# Altium schematic symbol library jlcpcb_2025_04_capacitors_extended_0603.schlib: 3668 symbols (part 7 of 20) (continued)
## C0603N222J050T
designator C?  Capacitance: 2.2nF  (hidden comment: *)
Capacitor, Ceramic (MLCC), 2.2nF, ±5%, 50V, NP0, ±5%, SMD 0603; Manufacturer: IHHEC(HOLY STONE ENTERPRISE CO., LTD); Manufacturer Part Number: C0603N222J050T; Package Size: 0603; JLCPCB Basic Part: No; JLCPCB Part Number: C105905; Supplier 1: LCSC; Category: Capacitors - MLCC; Supplier Part Number 1: C105905; Tolerance: ±5%; Voltage Rating: 50V; Temperature Coefficient: NP0; RoHS: Yes; ComponentLink1Description: Datasheet; ComponentLink1URL: https://wmsc.lcsc.com/wmsc/upload/file/pdf/v2/lcsc/2304140030_IHHEC-HOLY-STONE-ENTERPRISE-CO---LTD-C0603N222J050T_C105905.pdf; ComponentLink2Description: JLCPCB Part URL; ComponentLink2URL: https://jlcpcb.com/partdetail/C105905; ComponentLink3Description: LCSC Part URL; ComponentLink3URL: https://lcsc.com/product-detail/Multilayer-Ceramic-Capacitors-MLCC---SMD-SMT_IHHECHOLY-STONE-ENTERPRISE-CO.%2C-LTD-IHHECHOLY-STONE-ENTERPRISE-CO.%2C-LTD-C0603N222J050T_C105905.html
footprint CAP-0603 (0603 (1608M) Capacitor)
pins: 1, 2

## C0603N470J050T
designator C?  Capacitance: 47pF  (hidden comment: *)
Capacitor, Ceramic (MLCC), 47pF, ±5%, 50V, NP0, ±5%, SMD 0603; Manufacturer: IHHEC(HOLY STONE ENTERPRISE CO., LTD); Manufacturer Part Number: C0603N470J050T; Package Size: 0603; JLCPCB Basic Part: No; JLCPCB Part Number: C915825; Supplier 1: LCSC; Category: Capacitors - MLCC; Supplier Part Number 1: C915825; Tolerance: ±5%; Voltage Rating: 50V; Temperature Coefficient: NP0; RoHS: Yes; ComponentLink1Description: Datasheet; ComponentLink1URL: https://wmsc.lcsc.com/wmsc/upload/file/pdf/v2/lcsc/2304140030_IHHEC-HOLY-STONE-ENTERPRISE-CO---LTD-C0603N470J050T_C915825.pdf; ComponentLink2Description: JLCPCB Part URL; ComponentLink2URL: https://jlcpcb.com/partdetail/C915825; ComponentLink3Description: LCSC Part URL; ComponentLink3URL: https://lcsc.com/product-detail/Multilayer-Ceramic-Capacitors-MLCC---SMD-SMT_IHHECHOLY-STONE-ENTERPRISE-CO.%2C-LTD-IHHECHOLY-STONE-ENTERPRISE-CO.%2C-LTD-C0603N470J050T_C915825.html
footprint CAP-0603 (0603 (1608M) Capacitor)
pins: 1, 2

## C0603X5R105K160NT
designator C?  Capacitance: 1uF  (hidden comment: *)
Capacitor, Ceramic (MLCC), 1uF, ±10%, 16V, X5R, ±10%, SMD 0603; Manufacturer: SANYEAR; Manufacturer Part Number: C0603X5R105K160NT; Package Size: 0603; JLCPCB Basic Part: No; JLCPCB Part Number: C475249; Supplier 1: LCSC; Category: Capacitors - MLCC; Supplier Part Number 1: C475249; Tolerance: ±10%; Voltage Rating: 16V; Temperature Coefficient: X5R; RoHS: Yes; ComponentLink1Description: Datasheet; ComponentLink1URL: https://wmsc.lcsc.com/wmsc/upload/file/pdf/v2/lcsc/2304140030_SANYEAR-C0603X5R105K160NT_C475249.pdf; ComponentLink2Description: JLCPCB Part URL; ComponentLink2URL: https://jlcpcb.com/partdetail/C475249; ComponentLink3Description: LCSC Part URL; ComponentLink3URL: https://lcsc.com/product-detail/Multilayer-Ceramic-Capacitors-MLCC---SMD-SMT_SANYEAR-SANYEAR-C0603X5R105K160NT_C475249.html
footprint CAP-0603 (0603 (1608M) Capacitor)
pins: 1, 2

## C0603X5R105K250NT
designator C?  Capacitance: 1uF  (hidden comment: *)
Capacitor, Ceramic (MLCC), 1uF, ±10%, 25V, X5R, ±10%, SMD 0603; Manufacturer: SANYEAR; Manufacturer Part Number: C0603X5R105K250NT; Package Size: 0603; JLCPCB Basic Part: No; JLCPCB Part Number: C466771; Supplier 1: LCSC; Category: Capacitors - MLCC; Supplier Part Number 1: C466771; Tolerance: ±10%; Voltage Rating: 25V; Temperature Coefficient: X5R; RoHS: Yes; ComponentLink1Description: Datasheet; ComponentLink1URL: https://wmsc.lcsc.com/wmsc/upload/file/pdf/v2/lcsc/2304140030_SANYEAR-C0603X5R105K250NT_C466771.pdf; ComponentLink2Description: JLCPCB Part URL; ComponentLink2URL: https://jlcpcb.com/partdetail/C466771; ComponentLink3Description: LCSC Part URL; ComponentLink3URL: https://lcsc.com/product-detail/Multilayer-Ceramic-Capacitors-MLCC---SMD-SMT_SANYEAR-SANYEAR-C0603X5R105K250NT_C466771.html
footprint CAP-0603 (0603 (1608M) Capacitor)
pins: 1, 2

## C0603X5R106K6R3NT
designator C?  Capacitance: 10uF  (hidden comment: *)
Capacitor, Ceramic (MLCC), 10uF, ±10%, 6.3V, X5R, ±10%, SMD 0603; Manufacturer: SANYEAR; Manufacturer Part Number: C0603X5R106K6R3NT; Package Size: 0603; JLCPCB Basic Part: No; JLCPCB Part Number: C475250; Supplier 1: LCSC; Category: Capacitors - MLCC; Supplier Part Number 1: C475250; Tolerance: ±10%; Voltage Rating: 6.3V; Temperature Coefficient: X5R; RoHS: Yes; ComponentLink1Description: Datasheet; ComponentLink1URL: https://wmsc.lcsc.com/wmsc/upload/file/pdf/v2/lcsc/2304140030_SANYEAR-C0603X5R106K6R3NT_C475250.pdf; ComponentLink2Description: JLCPCB Part URL; ComponentLink2URL: https://jlcpcb.com/partdetail/C475250; ComponentLink3Description: LCSC Part URL; ComponentLink3URL: https://lcsc.com/product-detail/Multilayer-Ceramic-Capacitors-MLCC---SMD-SMT_SANYEAR-SANYEAR-C0603X5R106K6R3NT_C475250.html
footprint CAP-0603 (0603 (1608M) Capacitor)
pins: 1, 2

## C0603X5R106K6R3NTK
designator C?  Capacitance: 10uF  (hidden comment: *)
Capacitor, Ceramic (MLCC), 10uF, ±10%, 6.3V, X5R, ±10%, SMD 0603; Manufacturer: EYANG(Shenzhen Eyang Tech Development); Manufacturer Part Number: C0603X5R106K6R3NTK; Package Size: 0603; JLCPCB Basic Part: No; JLCPCB Part Number: C115692; Supplier 1: LCSC; Category: Capacitors - MLCC; Supplier Part Number 1: C115692; Tolerance: ±10%; Voltage Rating: 6.3V; Temperature Coefficient: X5R; RoHS: Yes; ComponentLink1Description: Datasheet; ComponentLink1URL: https://datasheet.lcsc.com/lcsc/2304140030_EYANG-Shenzhen-Eyang-Tech-Development-C0603X5R106K6R3NTK_C115692.pdf; ComponentLink2Description: JLCPCB Part URL; ComponentLink2URL: https://jlcpcb.com/partdetail/C115692; ComponentLink3Description: LCSC Part URL; ComponentLink3URL: https://lcsc.com/product-detail/Multilayer-Ceramic-Capacitors-MLCC---SMD-SMT_EYANGShenzhen-Eyang-Tech-Development-EYANGShenzhen-Eyang-Tech-Development-C0603X5R106K6R3NTK_C115692.html
footprint CAP-0603 (0603 (1608M) Capacitor)
pins: 1, 2

## C0603X5R106M100NT
designator C?  Capacitance: 10uF  (hidden comment: *)
Capacitor, Ceramic (MLCC), 10uF, ±20%, 10V, X5R, ±20%, SMD 0603; Manufacturer: SANYEAR; Manufacturer Part Number: C0603X5R106M100NT; Package Size: 0603; JLCPCB Basic Part: No; JLCPCB Part Number: C466780; Supplier 1: LCSC; Category: Capacitors - MLCC; Supplier Part Number 1: C466780; Tolerance: ±20%; Voltage Rating: 10V; Temperature Coefficient: X5R; RoHS: Yes; ComponentLink1Description: Datasheet; ComponentLink1URL: https://wmsc.lcsc.com/wmsc/upload/file/pdf/v2/lcsc/2304140030_SANYEAR-C0603X5R106M100NT_C466780.pdf; ComponentLink2Description: JLCPCB Part URL; ComponentLink2URL: https://jlcpcb.com/partdetail/C466780; ComponentLink3Description: LCSC Part URL; ComponentLink3URL: https://lcsc.com/product-detail/Multilayer-Ceramic-Capacitors-MLCC---SMD-SMT_SANYEAR-SANYEAR-C0603X5R106M100NT_C466780.html
footprint CAP-0603 (0603 (1608M) Capacitor)
pins: 1, 2

## C0603X5R106M160NT
designator C?  Capacitance: 10uF  (hidden comment: *)
Capacitor, Ceramic (MLCC), 10uF, ±20%, 16V, X5R, ±20%, SMD 0603; Manufacturer: SANYEAR; Manufacturer Part Number: C0603X5R106M160NT; Package Size: 0603; JLCPCB Basic Part: No; JLCPCB Part Number: C466781; Supplier 1: LCSC; Category: Capacitors - MLCC; Supplier Part Number 1: C466781; Tolerance: ±20%; Voltage Rating: 16V; Temperature Coefficient: X5R; RoHS: Yes; ComponentLink1Description: Datasheet; ComponentLink1URL: https://wmsc.lcsc.com/wmsc/upload/file/pdf/v2/lcsc/2304140030_SANYEAR-C0603X5R106M160NT_C466781.pdf; ComponentLink2Description: JLCPCB Part URL; ComponentLink2URL: https://jlcpcb.com/partdetail/C466781; ComponentLink3Description: LCSC Part URL; ComponentLink3URL: https://lcsc.com/product-detail/Multilayer-Ceramic-Capacitors-MLCC---SMD-SMT_SANYEAR-SANYEAR-C0603X5R106M160NT_C466781.html
footprint CAP-0603 (0603 (1608M) Capacitor)
pins: 1, 2

## C0603X5R225K160NT
designator C?  Capacitance: 2.2uF  (hidden comment: *)
Capacitor, Ceramic (MLCC), 2.2uF, ±10%, 16V, ±10%, SMD 0603; Manufacturer: SANYEAR; Manufacturer Part Number: C0603X5R225K160NT; Package Size: 0603; JLCPCB Basic Part: No; JLCPCB Part Number: C466773; Supplier 1: LCSC; Category: Capacitors - MLCC; Supplier Part Number 1: C466773; Tolerance: ±10%; Voltage Rating: 16V; RoHS: Yes; ComponentLink1Description: Datasheet; ComponentLink1URL: https://wmsc.lcsc.com/wmsc/upload/file/pdf/v2/lcsc/2304140030_SANYEAR-C0603X5R225K160NT_C466773.pdf; ComponentLink2Description: JLCPCB Part URL; ComponentLink2URL: https://jlcpcb.com/partdetail/C466773; ComponentLink3Description: LCSC Part URL; ComponentLink3URL: https://lcsc.com/product-detail/Multilayer-Ceramic-Capacitors-MLCC---SMD-SMT_SANYEAR-SANYEAR-C0603X5R225K160NT_C466773.html
footprint CAP-0603 (0603 (1608M) Capacitor)
pins: 1, 2

## C0603X5R474K500NT
designator C?  Capacitance: 470nF  (hidden comment: *)
Capacitor, Ceramic (MLCC), 470nF, ±10%, 50V, ±10%, SMD 0603; Manufacturer: SANYEAR; Manufacturer Part Number: C0603X5R474K500NT; Package Size: 0603; JLCPCB Basic Part: No; JLCPCB Part Number: C729461; Supplier 1: LCSC; Category: Capacitors - MLCC; Supplier Part Number 1: C729461; Tolerance: ±10%; Voltage Rating: 50V; RoHS: Yes; ComponentLink1Description: Datasheet; ComponentLink1URL: https://wmsc.lcsc.com/wmsc/upload/file/pdf/v2/lcsc/2304140030_SANYEAR-C0603X5R474K500NT_C729461.pdf; ComponentLink2Description: JLCPCB Part URL; ComponentLink2URL: https://jlcpcb.com/partdetail/C729461; ComponentLink3Description: LCSC Part URL; ComponentLink3URL: https://lcsc.com/product-detail/Multilayer-Ceramic-Capacitors-MLCC---SMD-SMT_SANYEAR-SANYEAR-C0603X5R474K500NT_C729461.html
footprint CAP-0603 (0603 (1608M) Capacitor)
pins: 1, 2

## C0603X6S106M4R0NT
designator C?  Capacitance: 10uF  (hidden comment: *)
Capacitor, Ceramic (MLCC), 10uF, ±20%, 4V, ±20%, SMD 0603; Manufacturer: SANYEAR; Manufacturer Part Number: C0603X6S106M4R0NT; Package Size: 0603; JLCPCB Basic Part: No; JLCPCB Part Number: C2844382; Supplier 1: LCSC; Category: Capacitors - MLCC; Supplier Part Number 1: C2844382; Tolerance: ±20%; Voltage Rating: 4V; RoHS: Yes; ComponentLink1Description: Datasheet; ComponentLink1URL: https://wmsc.lcsc.com/wmsc/upload/file/pdf/v2/lcsc/2304140030_SANYEAR-C0603X6S106M4R0NT_C2844382.pdf; ComponentLink2Description: JLCPCB Part URL; ComponentLink2URL: https://jlcpcb.com/partdetail/C2844382; ComponentLink3Description: LCSC Part URL; ComponentLink3URL: https://lcsc.com/product-detail/Multilayer-Ceramic-Capacitors-MLCC---SMD-SMT_SANYEAR-SANYEAR-C0603X6S106M4R0NT_C2844382.html
footprint CAP-0603 (0603 (1608M) Capacitor)
pins: 1, 2

## C0603X6S106M160NT
designator C?  Capacitance: 10uF  (hidden comment: *)
Capacitor, Ceramic (MLCC), 10uF, ±20%, 16V, ±20%, SMD 0603; Manufacturer: SANYEAR; Manufacturer Part Number: C0603X6S106M160NT; Package Size: 0603; JLCPCB Basic Part: No; JLCPCB Part Number: C2835565; Supplier 1: LCSC; Category: Capacitors - MLCC; Supplier Part Number 1: C2835565; Tolerance: ±20%; Voltage Rating: 16V; RoHS: Yes; ComponentLink1Description: Datasheet; ComponentLink1URL: https://wmsc.lcsc.com/wmsc/upload/file/pdf/v2/lcsc/2304140030_SANYEAR-C0603X6S106M160NT_C2835565.pdf; ComponentLink2Description: JLCPCB Part URL; ComponentLink2URL: https://jlcpcb.com/partdetail/C2835565; ComponentLink3Description: LCSC Part URL; ComponentLink3URL: https://lcsc.com/product-detail/Multilayer-Ceramic-Capacitors-MLCC---SMD-SMT_SANYEAR-SANYEAR-C0603X6S106M160NT_C2835565.html
footprint CAP-0603 (0603 (1608M) Capacitor)
pins: 1, 2

## C0603X6S226M6R3NT
designator C?  Capacitance: 22uF  (hidden comment: *)
Capacitor, Ceramic (MLCC), 22uF, ±20%, 6.3V, ±20%, SMD 0603; Manufacturer: SANYEAR; Manufacturer Part Number: C0603X6S226M6R3NT; Package Size: 0603; JLCPCB Basic Part: No; JLCPCB Part Number: C2835554; Supplier 1: LCSC; Category: Capacitors - MLCC; Supplier Part Number 1: C2835554; Tolerance: ±20%; Voltage Rating: 6.3V; RoHS: Yes; ComponentLink1Description: Datasheet; ComponentLink1URL: https://wmsc.lcsc.com/wmsc/upload/file/pdf/v2/lcsc/2304140030_SANYEAR-C0603X6S226M6R3NT_C2835554.pdf; ComponentLink2Description: JLCPCB Part URL; ComponentLink2URL: https://jlcpcb.com/partdetail/C2835554; ComponentLink3Description: LCSC Part URL; ComponentLink3URL: https://lcsc.com/product-detail/Multilayer-Ceramic-Capacitors-MLCC---SMD-SMT_SANYEAR-SANYEAR-C0603X6S226M6R3NT_C2835554.html
footprint CAP-0603 (0603 (1608M) Capacitor)
pins: 1, 2

## C0603X6S475K6R3NT
designator C?  Capacitance: 4.7uF  (hidden comment: *)
Capacitor, Ceramic (MLCC), 4.7uF, ±10%, 6.3V, ±10%, SMD 0603; Manufacturer: SANYEAR; Manufacturer Part Number: C0603X6S475K6R3NT; Package Size: 0603; JLCPCB Basic Part: No; JLCPCB Part Number: C2844381; Supplier 1: LCSC; Category: Capacitors - MLCC; Supplier Part Number 1: C2844381; Tolerance: ±10%; Voltage Rating: 6.3V; RoHS: Yes; ComponentLink1Description: Datasheet; ComponentLink1URL: https://wmsc.lcsc.com/wmsc/upload/file/pdf/v2/lcsc/2304140030_SANYEAR-C0603X6S475K6R3NT_C2844381.pdf; ComponentLink2Description: JLCPCB Part URL; ComponentLink2URL: https://jlcpcb.com/partdetail/C2844381; ComponentLink3Description: LCSC Part URL; ComponentLink3URL: https://lcsc.com/product-detail/Multilayer-Ceramic-Capacitors-MLCC---SMD-SMT_SANYEAR-SANYEAR-C0603X6S475K6R3NT_C2844381.html
footprint CAP-0603 (0603 (1608M) Capacitor)
pins: 1, 2

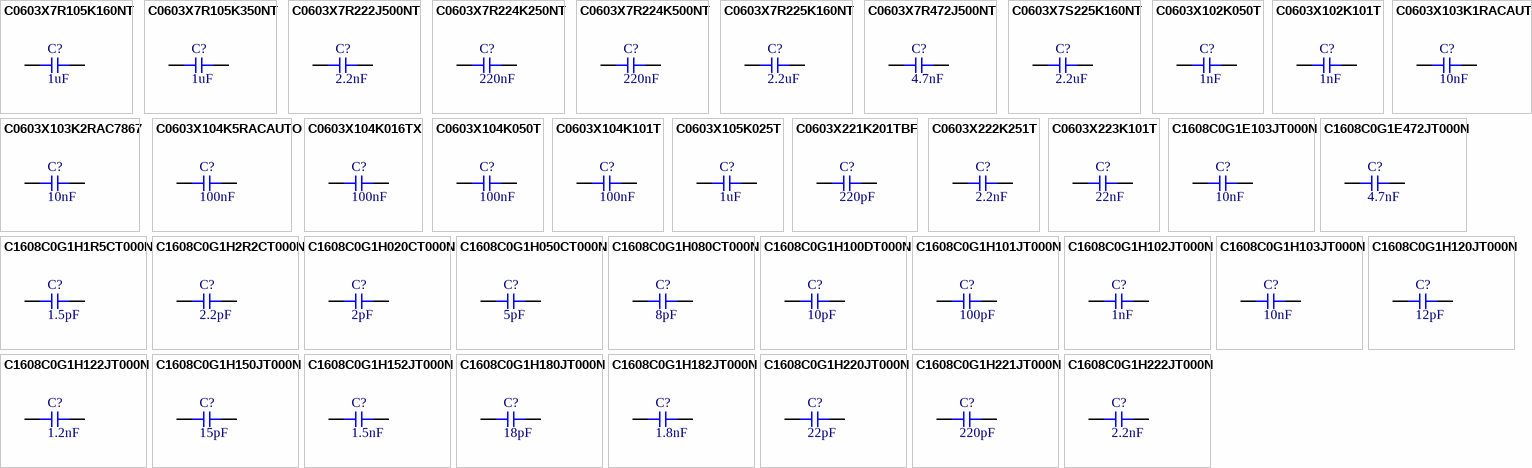
[diagram p29: symbols C0603X7R105K160NT to C1608C0G1H222JT000N]

## C0603X7R105K160NT
designator C?  Capacitance: 1uF  (hidden comment: *)
Capacitor, Ceramic (MLCC), 1uF, ±10%, 16V, X7R, ±10%, SMD 0603; Manufacturer: SANYEAR; Manufacturer Part Number: C0603X7R105K160NT; Package Size: 0603; JLCPCB Basic Part: No; JLCPCB Part Number: C466770; Supplier 1: LCSC; Category: Capacitors - MLCC; Supplier Part Number 1: C466770; Tolerance: ±10%; Voltage Rating: 16V; Temperature Coefficient: X7R; RoHS: Yes; ComponentLink1Description: Datasheet; ComponentLink1URL: https://wmsc.lcsc.com/wmsc/upload/file/pdf/v2/lcsc/2304140030_SANYEAR-C0603X7R105K160NT_C466770.pdf; ComponentLink2Description: JLCPCB Part URL; ComponentLink2URL: https://jlcpcb.com/partdetail/C466770; ComponentLink3Description: LCSC Part URL; ComponentLink3URL: https://lcsc.com/product-detail/Multilayer-Ceramic-Capacitors-MLCC---SMD-SMT_SANYEAR-SANYEAR-C0603X7R105K160NT_C466770.html
footprint CAP-0603 (0603 (1608M) Capacitor)
pins: 1, 2

## C0603X7R105K350NT
designator C?  Capacitance: 1uF  (hidden comment: *)
Capacitor, Ceramic (MLCC), 1uF, ±10%, 35V, ±10%, SMD 0603; Manufacturer: SANYEAR; Manufacturer Part Number: C0603X7R105K350NT; Package Size: 0603; JLCPCB Basic Part: No; JLCPCB Part Number: C968776; Supplier 1: LCSC; Category: Capacitors - MLCC; Supplier Part Number 1: C968776; Tolerance: ±10%; Voltage Rating: 35V; RoHS: Yes; ComponentLink1Description: Datasheet; ComponentLink2Description: JLCPCB Part URL; ComponentLink2URL: https://jlcpcb.com/partdetail/C968776; ComponentLink3Description: LCSC Part URL; ComponentLink3URL: https://lcsc.com/product-detail/Multilayer-Ceramic-Capacitors-MLCC---SMD-SMT_SANYEAR-SANYEAR-C0603X7R105K350NT_C968776.html
footprint CAP-0603 (0603 (1608M) Capacitor)
pins: 1, 2

## C0603X7R222J500NT
designator C?  Capacitance: 2.2nF  (hidden comment: *)
Capacitor, Ceramic (MLCC), 2.2nF, 50V, SMD 0603; Manufacturer: SANYEAR; Manufacturer Part Number: C0603X7R222J500NT; Package Size: 0603; JLCPCB Basic Part: No; JLCPCB Part Number: C2835545; Supplier 1: LCSC; Category: Capacitors - MLCC; Supplier Part Number 1: C2835545; Voltage Rating: 50V; RoHS: Yes; ComponentLink1Description: Datasheet; ComponentLink1URL: https://wmsc.lcsc.com/wmsc/upload/file/pdf/v2/lcsc/2304140030_SANYEAR-C0603X7R222J500NT_C2835545.pdf; ComponentLink2Description: JLCPCB Part URL; ComponentLink2URL: https://jlcpcb.com/partdetail/C2835545; ComponentLink3Description: LCSC Part URL; ComponentLink3URL: https://lcsc.com/product-detail/Multilayer-Ceramic-Capacitors-MLCC---SMD-SMT_SANYEAR-SANYEAR-C0603X7R222J500NT_C2835545.html
footprint CAP-0603 (0603 (1608M) Capacitor)
pins: 1, 2

## C0603X7R224K250NT
designator C?  Capacitance: 220nF  (hidden comment: *)
Capacitor, Ceramic (MLCC), 220nF, ±10%, 25V, ±10%, SMD 0603; Manufacturer: SANYEAR; Manufacturer Part Number: C0603X7R224K250NT; Package Size: 0603; JLCPCB Basic Part: No; JLCPCB Part Number: C729458; Supplier 1: LCSC; Category: Capacitors - MLCC; Supplier Part Number 1: C729458; Tolerance: ±10%; Voltage Rating: 25V; RoHS: Yes; ComponentLink1Description: Datasheet; ComponentLink1URL: https://wmsc.lcsc.com/wmsc/upload/file/pdf/v2/lcsc/2304140030_SANYEAR-C0603X7R224K250NT_C729458.pdf; ComponentLink2Description: JLCPCB Part URL; ComponentLink2URL: https://jlcpcb.com/partdetail/C729458; ComponentLink3Description: LCSC Part URL; ComponentLink3URL: https://lcsc.com/product-detail/Multilayer-Ceramic-Capacitors-MLCC---SMD-SMT_SANYEAR-SANYEAR-C0603X7R224K250NT_C729458.html
footprint CAP-0603 (0603 (1608M) Capacitor)
pins: 1, 2

## C0603X7R224K500NT
designator C?  Capacitance: 220nF  (hidden comment: *)
Capacitor, Ceramic (MLCC), 220nF, ±10%, 50V, ±10%, SMD 0603; Manufacturer: SANYEAR; Manufacturer Part Number: C0603X7R224K500NT; Package Size: 0603; JLCPCB Basic Part: No; JLCPCB Part Number: C729459; Supplier 1: LCSC; Category: Capacitors - MLCC; Supplier Part Number 1: C729459; Tolerance: ±10%; Voltage Rating: 50V; RoHS: Yes; ComponentLink1Description: Datasheet; ComponentLink1URL: https://wmsc.lcsc.com/wmsc/upload/file/pdf/v2/lcsc/2304140030_SANYEAR-C0603X7R224K500NT_C729459.pdf; ComponentLink2Description: JLCPCB Part URL; ComponentLink2URL: https://jlcpcb.com/partdetail/C729459; ComponentLink3Description: LCSC Part URL; ComponentLink3URL: https://lcsc.com/product-detail/Multilayer-Ceramic-Capacitors-MLCC---SMD-SMT_SANYEAR-SANYEAR-C0603X7R224K500NT_C729459.html
footprint CAP-0603 (0603 (1608M) Capacitor)
pins: 1, 2

## C0603X7R225K160NT
designator C?  Capacitance: 2.2uF  (hidden comment: *)
Capacitor, Ceramic (MLCC), 2.2uF, 16V, SMD 0603; Manufacturer: SANYEAR; Manufacturer Part Number: C0603X7R225K160NT; Package Size: 0603; JLCPCB Basic Part: No; JLCPCB Part Number: C2835569; Supplier 1: LCSC; Category: Capacitors - MLCC; Supplier Part Number 1: C2835569; Voltage Rating: 16V; RoHS: Yes; ComponentLink1Description: Datasheet; ComponentLink1URL: https://wmsc.lcsc.com/wmsc/upload/file/pdf/v2/lcsc/2106021034_SANYEAR-C0603X7R225K160NT_C2835569.pdf; ComponentLink2Description: JLCPCB Part URL; ComponentLink2URL: https://jlcpcb.com/partdetail/C2835569; ComponentLink3Description: LCSC Part URL; ComponentLink3URL: https://lcsc.com/product-detail/Multilayer-Ceramic-Capacitors-MLCC---SMD-SMT_SANYEAR-SANYEAR-C0603X7R225K160NT_C2835569.html
footprint CAP-0603 (0603 (1608M) Capacitor)
pins: 1, 2

## C0603X7R472J500NT
designator C?  Capacitance: 4.7nF  (hidden comment: *)
Capacitor, Ceramic (MLCC), 4.7nF, 50V, SMD 0603; Manufacturer: SANYEAR; Manufacturer Part Number: C0603X7R472J500NT; Package Size: 0603; JLCPCB Basic Part: No; JLCPCB Part Number: C2835550; Supplier 1: LCSC; Category: Capacitors - MLCC; Supplier Part Number 1: C2835550; Voltage Rating: 50V; RoHS: Yes; ComponentLink1Description: Datasheet; ComponentLink1URL: https://wmsc.lcsc.com/wmsc/upload/file/pdf/v2/lcsc/2304140030_SANYEAR-C0603X7R472J500NT_C2835550.pdf; ComponentLink2Description: JLCPCB Part URL; ComponentLink2URL: https://jlcpcb.com/partdetail/C2835550; ComponentLink3Description: LCSC Part URL; ComponentLink3URL: https://lcsc.com/product-detail/Multilayer-Ceramic-Capacitors-MLCC---SMD-SMT_SANYEAR-SANYEAR-C0603X7R472J500NT_C2835550.html
footprint CAP-0603 (0603 (1608M) Capacitor)
pins: 1, 2

## C0603X7S225K160NT
designator C?  Capacitance: 2.2uF  (hidden comment: *)
Capacitor, Ceramic (MLCC), 2.2uF, ±10%, 16V, X7S, ±10%, SMD 0603; Manufacturer: SANYEAR; Manufacturer Part Number: C0603X7S225K160NT; Package Size: 0603; JLCPCB Basic Part: No; JLCPCB Part Number: C2859193; Supplier 1: LCSC; Category: Capacitors - MLCC; Supplier Part Number 1: C2859193; Tolerance: ±10%; Voltage Rating: 16V; Temperature Coefficient: X7S; RoHS: Yes; ComponentLink1Description: Datasheet; ComponentLink1URL: https://wmsc.lcsc.com/wmsc/upload/file/pdf/v2/lcsc/2108170930_SANYEAR-C0603X7S225K160NT_C2859193.pdf; ComponentLink2Description: JLCPCB Part URL; ComponentLink2URL: https://jlcpcb.com/partdetail/C2859193; ComponentLink3Description: LCSC Part URL; ComponentLink3URL: https://lcsc.com/product-detail/Multilayer-Ceramic-Capacitors-MLCC---SMD-SMT_SANYEAR-SANYEAR-C0603X7S225K160NT_C2859193.html
footprint CAP-0603 (0603 (1608M) Capacitor)
pins: 1, 2

## C0603X102K050T
designator C?  Capacitance: 1nF  (hidden comment: *)
Capacitor, Ceramic (MLCC), 1nF, ±10%, 50V, X7R, ±10%, SMD 0603; Manufacturer: IHHEC(HOLY STONE ENTERPRISE CO., LTD); Manufacturer Part Number: C0603X102K050T; Package Size: 0603; JLCPCB Basic Part: No; JLCPCB Part Number: C915814; Supplier 1: LCSC; Category: Capacitors - MLCC; Supplier Part Number 1: C915814; Tolerance: ±10%; Voltage Rating: 50V; Temperature Coefficient: X7R; RoHS: Yes; ComponentLink1Description: Datasheet; ComponentLink1URL: https://wmsc.lcsc.com/wmsc/upload/file/pdf/v2/lcsc/2304140030_IHHEC-HOLY-STONE-ENTERPRISE-CO---LTD-C0603X102K050T_C915814.pdf; ComponentLink2Description: JLCPCB Part URL; ComponentLink2URL: https://jlcpcb.com/partdetail/C915814; ComponentLink3Description: LCSC Part URL; ComponentLink3URL: https://lcsc.com/product-detail/Multilayer-Ceramic-Capacitors-MLCC---SMD-SMT_IHHECHOLY-STONE-ENTERPRISE-CO.%2C-LTD-IHHECHOLY-STONE-ENTERPRISE-CO.%2C-LTD-C0603X102K050T_C915814.html
footprint CAP-0603 (0603 (1608M) Capacitor)
pins: 1, 2

## C0603X102K101T
designator C?  Capacitance: 1nF  (hidden comment: *)
Capacitor, Ceramic (MLCC), 1nF, ±10%, 100V, X7R, ±10%, SMD 0603; Manufacturer: IHHEC(HOLY STONE ENTERPRISE CO., LTD); Manufacturer Part Number: C0603X102K101T; Package Size: 0603; JLCPCB Basic Part: No; JLCPCB Part Number: C2991914; Supplier 1: LCSC; Category: Capacitors - MLCC; Supplier Part Number 1: C2991914; Tolerance: ±10%; Voltage Rating: 100V; Temperature Coefficient: X7R; RoHS: Yes; ComponentLink1Description: Datasheet; ComponentLink1URL: https://wmsc.lcsc.com/wmsc/upload/file/pdf/v2/lcsc/2204081830_IHHEC-HOLY-STONE-ENTERPRISE-CO---LTD-C0603X102K101T_C2991914.pdf; ComponentLink2Description: JLCPCB Part URL; ComponentLink2URL: https://jlcpcb.com/partdetail/C2991914; ComponentLink3Description: LCSC Part URL; ComponentLink3URL: https://lcsc.com/product-detail/Multilayer-Ceramic-Capacitors-MLCC---SMD-SMT_IHHECHOLY-STONE-ENTERPRISE-CO.%2C-LTD-IHHECHOLY-STONE-ENTERPRISE-CO.%2C-LTD-C0603X102K101T_C2991914.html
footprint CAP-0603 (0603 (1608M) Capacitor)
pins: 1, 2

## C0603X103K1RACAUTO
designator C?  Capacitance: 10nF  (hidden comment: *)
Capacitor, Ceramic (MLCC), 10nF, ±10%, 100V, X7R, ±10%, SMD 0603; Manufacturer: KEMET; Manufacturer Part Number: C0603X103K1RACAUTO; Package Size: 0603; JLCPCB Basic Part: No; JLCPCB Part Number: C599808; Supplier 1: LCSC; Category: Capacitors - MLCC; Supplier Part Number 1: C599808; Tolerance: ±10%; Voltage Rating: 100V; Temperature Coefficient: X7R; RoHS: Yes; ComponentLink1Description: Datasheet; ComponentLink1URL: https://wmsc.lcsc.com/wmsc/upload/file/pdf/v2/lcsc/2304140030_KEMET-C0603X103K1RACAUTO_C599808.pdf; ComponentLink2Description: JLCPCB Part URL; ComponentLink2URL: https://jlcpcb.com/partdetail/C599808; ComponentLink3Description: LCSC Part URL; ComponentLink3URL: https://lcsc.com/product-detail/Multilayer-Ceramic-Capacitors-MLCC---SMD-SMT_KEMET-KEMET-C0603X103K1RACAUTO_C599808.html
footprint CAP-0603 (0603 (1608M) Capacitor)
pins: 1, 2

## C0603X103K2RAC7867
designator C?  Capacitance: 10nF  (hidden comment: *)
Capacitor, Ceramic (MLCC), 10nF, ±10%, 200V, X7R, ±10%, SMD 0603; Manufacturer: KEMET; Manufacturer Part Number: C0603X103K2RAC7867; Package Size: 0603; JLCPCB Basic Part: No; JLCPCB Part Number: C599809; Supplier 1: LCSC; Category: Capacitors - MLCC; Supplier Part Number 1: C599809; Tolerance: ±10%; Voltage Rating: 200V; Temperature Coefficient: X7R; RoHS: Yes; ComponentLink1Description: Datasheet; ComponentLink1URL: https://wmsc.lcsc.com/wmsc/upload/file/pdf/v2/lcsc/2304140030_KEMET-C0603X103K2RAC7867_C599809.pdf; ComponentLink2Description: JLCPCB Part URL; ComponentLink2URL: https://jlcpcb.com/partdetail/C599809; ComponentLink3Description: LCSC Part URL; ComponentLink3URL: https://lcsc.com/product-detail/Multilayer-Ceramic-Capacitors-MLCC---SMD-SMT_KEMET-KEMET-C0603X103K2RAC7867_C599809.html
footprint CAP-0603 (0603 (1608M) Capacitor)
pins: 1, 2

## C0603X104K5RACAUTO
designator C?  Capacitance: 100nF  (hidden comment: *)
Capacitor, Ceramic (MLCC), 100nF, ±10%, 50V, X7R, ±10%, SMD 0603; Manufacturer: KEMET; Manufacturer Part Number: C0603X104K5RACAUTO; Package Size: 0603; JLCPCB Basic Part: No; JLCPCB Part Number: C561809; Supplier 1: LCSC; Category: Capacitors - MLCC; Supplier Part Number 1: C561809; Tolerance: ±10%; Voltage Rating: 50V; Temperature Coefficient: X7R; RoHS: Yes; ComponentLink1Description: Datasheet; ComponentLink1URL: https://wmsc.lcsc.com/wmsc/upload/file/pdf/v2/lcsc/2304140030_KEMET-C0603X104K5RACAUTO_C561809.pdf; ComponentLink2Description: JLCPCB Part URL; ComponentLink2URL: https://jlcpcb.com/partdetail/C561809; ComponentLink3Description: LCSC Part URL; ComponentLink3URL: https://lcsc.com/product-detail/Multilayer-Ceramic-Capacitors-MLCC---SMD-SMT_KEMET-KEMET-C0603X104K5RACAUTO_C561809.html
footprint CAP-0603 (0603 (1608M) Capacitor)
pins: 1, 2

## C0603X104K016TX
designator C?  Capacitance: 100nF  (hidden comment: *)
Capacitor, Ceramic (MLCC), 100nF, ±10%, 16V, X7R, ±10%, SMD 0603; Manufacturer: IHHEC(HOLY STONE ENTERPRISE CO., LTD); Manufacturer Part Number: C0603X104K016TX; Package Size: 0603; JLCPCB Basic Part: No; JLCPCB Part Number: C2940737; Supplier 1: LCSC; Category: Capacitors - MLCC; Supplier Part Number 1: C2940737; Tolerance: ±10%; Voltage Rating: 16V; Temperature Coefficient: X7R; RoHS: Yes; ComponentLink1Description: Datasheet; ComponentLink1URL: https://wmsc.lcsc.com/wmsc/upload/file/pdf/v2/lcsc/2201121900_IHHEC-HOLY-STONE-ENTERPRISE-CO---LTD-C0603X104K016TX_C2940737.pdf; ComponentLink2Description: JLCPCB Part URL; ComponentLink2URL: https://jlcpcb.com/partdetail/C2940737; ComponentLink3Description: LCSC Part URL; ComponentLink3URL: https://lcsc.com/product-detail/Multilayer-Ceramic-Capacitors-MLCC---SMD-SMT_IHHECHOLY-STONE-ENTERPRISE-CO.%2C-LTD-IHHECHOLY-STONE-ENTERPRISE-CO.%2C-LTD-C0603X104K016TX_C2940737.html
footprint CAP-0603 (0603 (1608M) Capacitor)
pins: 1, 2

## C0603X104K050T
designator C?  Capacitance: 100nF  (hidden comment: *)
Capacitor, Ceramic (MLCC), 100nF, ±10%, 50V, X7R, ±10%, SMD 0603; Manufacturer: IHHEC(HOLY STONE ENTERPRISE CO., LTD); Manufacturer Part Number: C0603X104K050T; Package Size: 0603; JLCPCB Basic Part: No; JLCPCB Part Number: C187860; Supplier 1: LCSC; Category: Capacitors - MLCC; Supplier Part Number 1: C187860; Tolerance: ±10%; Voltage Rating: 50V; Temperature Coefficient: X7R; RoHS: Yes; ComponentLink1Description: Datasheet; ComponentLink1URL: https://wmsc.lcsc.com/wmsc/upload/file/pdf/v2/lcsc/1811091225_IHHEC-HOLY-STONE-ENTERPRISE-CO---LTD-C0603X104K050T_C187860.pdf; ComponentLink2Description: JLCPCB Part URL; ComponentLink2URL: https://jlcpcb.com/partdetail/C187860; ComponentLink3Description: LCSC Part URL; ComponentLink3URL: https://lcsc.com/product-detail/Multilayer-Ceramic-Capacitors-MLCC---SMD-SMT_IHHECHOLY-STONE-ENTERPRISE-CO.%2C-LTD-IHHECHOLY-STONE-ENTERPRISE-CO.%2C-LTD-C0603X104K050T_C187860.html
footprint CAP-0603 (0603 (1608M) Capacitor)
pins: 1, 2

## C0603X104K101T
designator C?  Capacitance: 100nF  (hidden comment: *)
Capacitor, Ceramic (MLCC), 100nF, ±10%, 100V, X7R, ±10%, SMD 0603; Manufacturer: IHHEC(HOLY STONE ENTERPRISE CO., LTD); Manufacturer Part Number: C0603X104K101T; Package Size: 0603; JLCPCB Basic Part: No; JLCPCB Part Number: C105907; Supplier 1: LCSC; Category: Capacitors - MLCC; Supplier Part Number 1: C105907; Tolerance: ±10%; Voltage Rating: 100V; Temperature Coefficient: X7R; RoHS: Yes; ComponentLink1Description: Datasheet; ComponentLink1URL: https://wmsc.lcsc.com/wmsc/upload/file/pdf/v2/lcsc/2304140030_IHHEC-HOLY-STONE-ENTERPRISE-CO---LTD-C0603X104K101T_C105907.pdf; ComponentLink2Description: JLCPCB Part URL; ComponentLink2URL: https://jlcpcb.com/partdetail/C105907; ComponentLink3Description: LCSC Part URL; ComponentLink3URL: https://lcsc.com/product-detail/Multilayer-Ceramic-Capacitors-MLCC---SMD-SMT_IHHECHOLY-STONE-ENTERPRISE-CO.%2C-LTD-IHHECHOLY-STONE-ENTERPRISE-CO.%2C-LTD-C0603X104K101T_C105907.html
footprint CAP-0603 (0603 (1608M) Capacitor)
pins: 1, 2

## C0603X105K025T
designator C?  Capacitance: 1uF  (hidden comment: *)
Capacitor, Ceramic (MLCC), 1uF, ±10%, 25V, X7R, ±10%, SMD 0603; Manufacturer: IHHEC(HOLY STONE ENTERPRISE CO., LTD); Manufacturer Part Number: C0603X105K025T; Package Size: 0603; JLCPCB Basic Part: No; JLCPCB Part Number: C559292; Supplier 1: LCSC; Category: Capacitors - MLCC; Supplier Part Number 1: C559292; Tolerance: ±10%; Voltage Rating: 25V; Temperature Coefficient: X7R; RoHS: Yes; ComponentLink1Description: Datasheet; ComponentLink1URL: https://wmsc.lcsc.com/wmsc/upload/file/pdf/v2/lcsc/2304140030_IHHEC-HOLY-STONE-ENTERPRISE-CO---LTD-C0603X105K025T_C559292.pdf; ComponentLink2Description: JLCPCB Part URL; ComponentLink2URL: https://jlcpcb.com/partdetail/C559292; ComponentLink3Description: LCSC Part URL; ComponentLink3URL: https://lcsc.com/product-detail/Multilayer-Ceramic-Capacitors-MLCC---SMD-SMT_IHHECHOLY-STONE-ENTERPRISE-CO.%2C-LTD-IHHECHOLY-STONE-ENTERPRISE-CO.%2C-LTD-C0603X105K025T_C559292.html
footprint CAP-0603 (0603 (1608M) Capacitor)
pins: 1, 2

## C0603X221K201TBF
designator C?  Capacitance: 220pF  (hidden comment: *)
Capacitor, Ceramic (MLCC), 220pF, 200V, X7R, SMD 0603; Manufacturer: IHHEC(HOLY STONE ENTERPRISE CO., LTD); Manufacturer Part Number: C0603X221K201TBF; Package Size: 0603; JLCPCB Basic Part: No; JLCPCB Part Number: C2991902; Supplier 1: LCSC; Category: Capacitors - MLCC; Supplier Part Number 1: C2991902; Voltage Rating: 200V; Temperature Coefficient: X7R; RoHS: Yes; ComponentLink1Description: Datasheet; ComponentLink1URL: https://wmsc.lcsc.com/wmsc/upload/file/pdf/v2/lcsc/2204131745_IHHEC-HOLY-STONE-ENTERPRISE-CO---LTD-C0603X221K201TBF_C2991902.pdf; ComponentLink2Description: JLCPCB Part URL; ComponentLink2URL: https://jlcpcb.com/partdetail/C2991902; ComponentLink3Description: LCSC Part URL; ComponentLink3URL: https://lcsc.com/product-detail/Multilayer-Ceramic-Capacitors-MLCC---SMD-SMT_IHHECHOLY-STONE-ENTERPRISE-CO.%2C-LTD-IHHECHOLY-STONE-ENTERPRISE-CO.%2C-LTD-C0603X221K201TBF_C2991902.html
footprint CAP-0603 (0603 (1608M) Capacitor)
pins: 1, 2

## C0603X222K251T
designator C?  Capacitance: 2.2nF  (hidden comment: *)
Capacitor, Ceramic (MLCC), 2.2nF, ±10%, 250V, X7R, ±10%, SMD 0603; Manufacturer: IHHEC(HOLY STONE ENTERPRISE CO., LTD); Manufacturer Part Number: C0603X222K251T; Package Size: 0603; JLCPCB Basic Part: No; JLCPCB Part Number: C559291; Supplier 1: LCSC; Category: Capacitors - MLCC; Supplier Part Number 1: C559291; Tolerance: ±10%; Voltage Rating: 250V; Temperature Coefficient: X7R; RoHS: Yes; ComponentLink1Description: Datasheet; ComponentLink1URL: https://wmsc.lcsc.com/wmsc/upload/file/pdf/v2/lcsc/2304140030_IHHEC-HOLY-STONE-ENTERPRISE-CO---LTD-C0603X222K251T_C559291.pdf; ComponentLink2Description: JLCPCB Part URL; ComponentLink2URL: https://jlcpcb.com/partdetail/C559291; ComponentLink3Description: LCSC Part URL; ComponentLink3URL: https://lcsc.com/product-detail/Multilayer-Ceramic-Capacitors-MLCC---SMD-SMT_IHHECHOLY-STONE-ENTERPRISE-CO.%2C-LTD-IHHECHOLY-STONE-ENTERPRISE-CO.%2C-LTD-C0603X222K251T_C559291.html
footprint CAP-0603 (0603 (1608M) Capacitor)
pins: 1, 2

## C0603X223K101T
designator C?  Capacitance: 22nF  (hidden comment: *)
Capacitor, Ceramic (MLCC), 22nF, ±10%, 100V, X7R, ±10%, SMD 0603; Manufacturer: IHHEC(HOLY STONE ENTERPRISE CO., LTD); Manufacturer Part Number: C0603X223K101T; Package Size: 0603; JLCPCB Basic Part: No; JLCPCB Part Number: C105909; Supplier 1: LCSC; Category: Capacitors - MLCC; Supplier Part Number 1: C105909; Tolerance: ±10%; Voltage Rating: 100V; Temperature Coefficient: X7R; RoHS: Yes; ComponentLink1Description: Datasheet; ComponentLink1URL: https://wmsc.lcsc.com/wmsc/upload/file/pdf/v2/lcsc/2304140030_IHHEC-HOLY-STONE-ENTERPRISE-CO---LTD-C0603X223K101T_C105909.pdf; ComponentLink2Description: JLCPCB Part URL; ComponentLink2URL: https://jlcpcb.com/partdetail/C105909; ComponentLink3Description: LCSC Part URL; ComponentLink3URL: https://lcsc.com/product-detail/Multilayer-Ceramic-Capacitors-MLCC---SMD-SMT_IHHECHOLY-STONE-ENTERPRISE-CO.%2C-LTD-IHHECHOLY-STONE-ENTERPRISE-CO.%2C-LTD-C0603X223K101T_C105909.html
footprint CAP-0603 (0603 (1608M) Capacitor)
pins: 1, 2

## C1608C0G1E103JT000N
designator C?  Capacitance: 10nF  (hidden comment: *)
Capacitor, Ceramic (MLCC), 10nF, ±5%, 25V, C0G, ±5%, SMD 0603; Manufacturer: TDK; Manufacturer Part Number: C1608C0G1E103JT000N; Package Size: 0603; JLCPCB Basic Part: No; JLCPCB Part Number: C343007; Supplier 1: LCSC; Category: Capacitors - MLCC; Supplier Part Number 1: C343007; Tolerance: ±5%; Voltage Rating: 25V; Temperature Coefficient: C0G; RoHS: Yes; ComponentLink1Description: Datasheet; ComponentLink1URL: https://wmsc.lcsc.com/wmsc/upload/file/pdf/v2/lcsc/2304140030_TDK-C1608C0G1E103JT000N_C343007.pdf; ComponentLink2Description: JLCPCB Part URL; ComponentLink2URL: https://jlcpcb.com/partdetail/C343007; ComponentLink3Description: LCSC Part URL; ComponentLink3URL: https://lcsc.com/product-detail/Multilayer-Ceramic-Capacitors-MLCC---SMD-SMT_TDK-TDK-C1608C0G1E103JT000N_C343007.html
footprint CAP-0603 (0603 (1608M) Capacitor)
pins: 1, 2

## C1608C0G1E472JT000N
designator C?  Capacitance: 4.7nF  (hidden comment: *)
Capacitor, Ceramic (MLCC), 4.7nF, ±5%, 25V, C0G, ±5%, SMD 0603; Manufacturer: TDK; Manufacturer Part Number: C1608C0G1E472JT000N; Package Size: 0603; JLCPCB Basic Part: No; JLCPCB Part Number: C445739; Supplier 1: LCSC; Category: Capacitors - MLCC; Supplier Part Number 1: C445739; Tolerance: ±5%; Voltage Rating: 25V; Temperature Coefficient: C0G; RoHS: Yes; ComponentLink1Description: Datasheet; ComponentLink1URL: https://wmsc.lcsc.com/wmsc/upload/file/pdf/v2/lcsc/2304140030_TDK-C1608C0G1E472JT000N_C445739.pdf; ComponentLink2Description: JLCPCB Part URL; ComponentLink2URL: https://jlcpcb.com/partdetail/C445739; ComponentLink3Description: LCSC Part URL; ComponentLink3URL: https://lcsc.com/product-detail/Multilayer-Ceramic-Capacitors-MLCC---SMD-SMT_TDK-TDK-C1608C0G1E472JT000N_C445739.html
footprint CAP-0603 (0603 (1608M) Capacitor)
pins: 1, 2

## C1608C0G1H1R5CT000N
designator C?  Capacitance: 1.5pF  (hidden comment: *)
Capacitor, Ceramic (MLCC), 1.5pF, 50V, C0G, SMD 0603; Manufacturer: TDK; Manufacturer Part Number: C1608C0G1H1R5CT000N; Package Size: 0603; JLCPCB Basic Part: No; JLCPCB Part Number: C695130; Supplier 1: LCSC; Category: Capacitors - MLCC; Supplier Part Number 1: C695130; Voltage Rating: 50V; Temperature Coefficient: C0G; RoHS: Yes; ComponentLink1Description: Datasheet; ComponentLink1URL: https://wmsc.lcsc.com/wmsc/upload/file/pdf/v2/lcsc/2304140030_TDK-C1608C0G1H1R5CT000N_C695130.pdf; ComponentLink2Description: JLCPCB Part URL; ComponentLink2URL: https://jlcpcb.com/partdetail/C695130; ComponentLink3Description: LCSC Part URL; ComponentLink3URL: https://lcsc.com/product-detail/Multilayer-Ceramic-Capacitors-MLCC---SMD-SMT_TDK-TDK-C1608C0G1H1R5CT000N_C695130.html
footprint CAP-0603 (0603 (1608M) Capacitor)
pins: 1, 2

## C1608C0G1H2R2CT000N
designator C?  Capacitance: 2.2pF  (hidden comment: *)
Capacitor, Ceramic (MLCC), 2.2pF, 50V, C0G, SMD 0603; Manufacturer: TDK; Manufacturer Part Number: C1608C0G1H2R2CT000N; Package Size: 0603; JLCPCB Basic Part: No; JLCPCB Part Number: C695133; Supplier 1: LCSC; Category: Capacitors - MLCC; Supplier Part Number 1: C695133; Voltage Rating: 50V; Temperature Coefficient: C0G; RoHS: Yes; ComponentLink1Description: Datasheet; ComponentLink1URL: https://wmsc.lcsc.com/wmsc/upload/file/pdf/v2/lcsc/2304140030_TDK-C1608C0G1H2R2CT000N_C695133.pdf; ComponentLink2Description: JLCPCB Part URL; ComponentLink2URL: https://jlcpcb.com/partdetail/C695133; ComponentLink3Description: LCSC Part URL; ComponentLink3URL: https://lcsc.com/product-detail/Multilayer-Ceramic-Capacitors-MLCC---SMD-SMT_TDK-TDK-C1608C0G1H2R2CT000N_C695133.html
footprint CAP-0603 (0603 (1608M) Capacitor)
pins: 1, 2

## C1608C0G1H020CT000N
designator C?  Capacitance: 2pF  (hidden comment: *)
Capacitor, Ceramic (MLCC), 2pF, 50V, C0G, SMD 0603; Manufacturer: TDK; Manufacturer Part Number: C1608C0G1H020CT000N; Package Size: 0603; JLCPCB Basic Part: No; JLCPCB Part Number: C695128; Supplier 1: LCSC; Category: Capacitors - MLCC; Supplier Part Number 1: C695128; Voltage Rating: 50V; Temperature Coefficient: C0G; RoHS: Yes; ComponentLink1Description: Datasheet; ComponentLink1URL: https://wmsc.lcsc.com/wmsc/upload/file/pdf/v2/lcsc/2304140030_TDK-C1608C0G1H020CT000N_C695128.pdf; ComponentLink2Description: JLCPCB Part URL; ComponentLink2URL: https://jlcpcb.com/partdetail/C695128; ComponentLink3Description: LCSC Part URL; ComponentLink3URL: https://lcsc.com/product-detail/Multilayer-Ceramic-Capacitors-MLCC---SMD-SMT_TDK-TDK-C1608C0G1H020CT000N_C695128.html
footprint CAP-0603 (0603 (1608M) Capacitor)
pins: 1, 2

## C1608C0G1H050CT000N
designator C?  Capacitance: 5pF  (hidden comment: *)
Capacitor, Ceramic (MLCC), 5pF, 50V, C0G, SMD 0603; Manufacturer: TDK; Manufacturer Part Number: C1608C0G1H050CT000N; Package Size: 0603; JLCPCB Basic Part: No; JLCPCB Part Number: C695129; Supplier 1: LCSC; Category: Capacitors - MLCC; Supplier Part Number 1: C695129; Voltage Rating: 50V; Temperature Coefficient: C0G; RoHS: Yes; ComponentLink1Description: Datasheet; ComponentLink1URL: https://wmsc.lcsc.com/wmsc/upload/file/pdf/v2/lcsc/2304140030_TDK-C1608C0G1H050CT000N_C695129.pdf; ComponentLink2Description: JLCPCB Part URL; ComponentLink2URL: https://jlcpcb.com/partdetail/C695129; ComponentLink3Description: LCSC Part URL; ComponentLink3URL: https://lcsc.com/product-detail/Multilayer-Ceramic-Capacitors-MLCC---SMD-SMT_TDK-TDK-C1608C0G1H050CT000N_C695129.html
footprint CAP-0603 (0603 (1608M) Capacitor)
pins: 1, 2

## C1608C0G1H080CT000N
designator C?  Capacitance: 8pF  (hidden comment: *)
Capacitor, Ceramic (MLCC), 8pF, 50V, C0G, SMD 0603; Manufacturer: TDK; Manufacturer Part Number: C1608C0G1H080CT000N; Package Size: 0603; JLCPCB Basic Part: No; JLCPCB Part Number: C575408; Supplier 1: LCSC; Category: Capacitors - MLCC; Supplier Part Number 1: C575408; Voltage Rating: 50V; Temperature Coefficient: C0G; RoHS: Yes; ComponentLink1Description: Datasheet; ComponentLink1URL: https://wmsc.lcsc.com/wmsc/upload/file/pdf/v2/lcsc/2304140030_TDK-C1608C0G1H080CT000N_C575408.pdf; ComponentLink2Description: JLCPCB Part URL; ComponentLink2URL: https://jlcpcb.com/partdetail/C575408; ComponentLink3Description: LCSC Part URL; ComponentLink3URL: https://lcsc.com/product-detail/Multilayer-Ceramic-Capacitors-MLCC---SMD-SMT_TDK-TDK-C1608C0G1H080CT000N_C575408.html
footprint CAP-0603 (0603 (1608M) Capacitor)
pins: 1, 2

## C1608C0G1H100DT000N
designator C?  Capacitance: 10pF  (hidden comment: *)
Capacitor, Ceramic (MLCC), 10pF, 50V, C0G, SMD 0603; Manufacturer: TDK; Manufacturer Part Number: C1608C0G1H100DT000N; Package Size: 0603; JLCPCB Basic Part: No; JLCPCB Part Number: C338015; Supplier 1: LCSC; Category: Capacitors - MLCC; Supplier Part Number 1: C338015; Voltage Rating: 50V; Temperature Coefficient: C0G; RoHS: Yes; ComponentLink1Description: Datasheet; ComponentLink1URL: https://wmsc.lcsc.com/wmsc/upload/file/pdf/v2/lcsc/2304140030_TDK-C1608C0G1H100DT000N_C338015.pdf; ComponentLink2Description: JLCPCB Part URL; ComponentLink2URL: https://jlcpcb.com/partdetail/C338015; ComponentLink3Description: LCSC Part URL; ComponentLink3URL: https://lcsc.com/product-detail/Multilayer-Ceramic-Capacitors-MLCC---SMD-SMT_TDK-TDK-C1608C0G1H100DT000N_C338015.html
footprint CAP-0603 (0603 (1608M) Capacitor)
pins: 1, 2

## C1608C0G1H101JT000N
designator C?  Capacitance: 100pF  (hidden comment: *)
Capacitor, Ceramic (MLCC), 100pF, ±5%, 50V, C0G, ±5%, SMD 0603; Manufacturer: TDK; Manufacturer Part Number: C1608C0G1H101JT000N; Package Size: 0603; JLCPCB Basic Part: No; JLCPCB Part Number: C183115; Supplier 1: LCSC; Category: Capacitors - MLCC; Supplier Part Number 1: C183115; Tolerance: ±5%; Voltage Rating: 50V; Temperature Coefficient: C0G; RoHS: Yes; ComponentLink1Description: Datasheet; ComponentLink1URL: https://wmsc.lcsc.com/wmsc/upload/file/pdf/v2/lcsc/2304140030_TDK-C1608C0G1H101JT000N_C183115.pdf; ComponentLink2Description: JLCPCB Part URL; ComponentLink2URL: https://jlcpcb.com/partdetail/C183115; ComponentLink3Description: LCSC Part URL; ComponentLink3URL: https://lcsc.com/product-detail/Multilayer-Ceramic-Capacitors-MLCC---SMD-SMT_TDK-TDK-C1608C0G1H101JT000N_C183115.html
footprint CAP-0603 (0603 (1608M) Capacitor)
pins: 1, 2

## C1608C0G1H102JT000N
designator C?  Capacitance: 1nF  (hidden comment: *)
Capacitor, Ceramic (MLCC), 1nF, ±5%, 50V, C0G, ±5%, SMD 0603; Manufacturer: TDK; Manufacturer Part Number: C1608C0G1H102JT000N; Package Size: 0603; JLCPCB Basic Part: No; JLCPCB Part Number: C342541; Supplier 1: LCSC; Category: Capacitors - MLCC; Supplier Part Number 1: C342541; Tolerance: ±5%; Voltage Rating: 50V; Temperature Coefficient: C0G; RoHS: Yes; ComponentLink1Description: Datasheet; ComponentLink1URL: https://wmsc.lcsc.com/wmsc/upload/file/pdf/v2/lcsc/2304140030_TDK-C1608C0G1H102JT000N_C342541.pdf; ComponentLink2Description: JLCPCB Part URL; ComponentLink2URL: https://jlcpcb.com/partdetail/C342541; ComponentLink3Description: LCSC Part URL; ComponentLink3URL: https://lcsc.com/product-detail/Multilayer-Ceramic-Capacitors-MLCC---SMD-SMT_TDK-TDK-C1608C0G1H102JT000N_C342541.html
footprint CAP-0603 (0603 (1608M) Capacitor)
pins: 1, 2

## C1608C0G1H103JT000N
designator C?  Capacitance: 10nF  (hidden comment: *)
Capacitor, Ceramic (MLCC), 10nF, ±5%, 50V, C0G, ±5%, SMD 0603; Manufacturer: TDK; Manufacturer Part Number: C1608C0G1H103JT000N; Package Size: 0603; JLCPCB Basic Part: No; JLCPCB Part Number: C76599; Supplier 1: LCSC; Category: Capacitors - MLCC; Supplier Part Number 1: C76599; Tolerance: ±5%; Voltage Rating: 50V; Temperature Coefficient: C0G; RoHS: Yes; ComponentLink1Description: Datasheet; ComponentLink1URL: https://wmsc.lcsc.com/wmsc/upload/file/pdf/v2/lcsc/2304140030_TDK-C1608C0G1H103JT000N_C76599.pdf; ComponentLink2Description: JLCPCB Part URL; ComponentLink2URL: https://jlcpcb.com/partdetail/C76599; ComponentLink3Description: LCSC Part URL; ComponentLink3URL: https://lcsc.com/product-detail/Multilayer-Ceramic-Capacitors-MLCC---SMD-SMT_TDK-TDK-C1608C0G1H103JT000N_C76599.html
footprint CAP-0603 (0603 (1608M) Capacitor)
pins: 1, 2

## C1608C0G1H120JT000N
designator C?  Capacitance: 12pF  (hidden comment: *)
Capacitor, Ceramic (MLCC), 12pF, ±5%, 50V, C0G, ±5%, SMD 0603; Manufacturer: TDK; Manufacturer Part Number: C1608C0G1H120JT000N; Package Size: 0603; JLCPCB Basic Part: No; JLCPCB Part Number: C183112; Supplier 1: LCSC; Category: Capacitors - MLCC; Supplier Part Number 1: C183112; Tolerance: ±5%; Voltage Rating: 50V; Temperature Coefficient: C0G; RoHS: Yes; ComponentLink1Description: Datasheet; ComponentLink1URL: https://wmsc.lcsc.com/wmsc/upload/file/pdf/v2/lcsc/2304140030_TDK-C1608C0G1H120JT000N_C183112.pdf; ComponentLink2Description: JLCPCB Part URL; ComponentLink2URL: https://jlcpcb.com/partdetail/C183112; ComponentLink3Description: LCSC Part URL; ComponentLink3URL: https://lcsc.com/product-detail/Multilayer-Ceramic-Capacitors-MLCC---SMD-SMT_TDK-TDK-C1608C0G1H120JT000N_C183112.html
footprint CAP-0603 (0603 (1608M) Capacitor)
pins: 1, 2

## C1608C0G1H122JT000N
designator C?  Capacitance: 1.2nF  (hidden comment: *)
Capacitor, Ceramic (MLCC), 1.2nF, ±5%, 50V, C0G, ±5%, SMD 0603; Manufacturer: TDK; Manufacturer Part Number: C1608C0G1H122JT000N; Package Size: 0603; JLCPCB Basic Part: No; JLCPCB Part Number: C342564; Supplier 1: LCSC; Category: Capacitors - MLCC; Supplier Part Number 1: C342564; Tolerance: ±5%; Voltage Rating: 50V; Temperature Coefficient: C0G; RoHS: Yes; ComponentLink1Description: Datasheet; ComponentLink1URL: https://wmsc.lcsc.com/wmsc/upload/file/pdf/v2/lcsc/2304140030_TDK-C1608C0G1H122JT000N_C342564.pdf; ComponentLink2Description: JLCPCB Part URL; ComponentLink2URL: https://jlcpcb.com/partdetail/C342564; ComponentLink3Description: LCSC Part URL; ComponentLink3URL: https://lcsc.com/product-detail/Multilayer-Ceramic-Capacitors-MLCC---SMD-SMT_TDK-TDK-C1608C0G1H122JT000N_C342564.html
footprint CAP-0603 (0603 (1608M) Capacitor)
pins: 1, 2
